# Altium schematic symbol library jlcpcb_2025_04_capacitors_extended_1210.schlib: 709 symbols (part 4 of 4) (continued)
## SQCB7M820FAT1A
designator C?  Capacitance: 82pF  (hidden comment: *)
Capacitor, Ceramic (MLCC), 82pF, ±1%, 500V, ±1%, SMD 1210; Manufacturer: AVX; Manufacturer Part Number: SQCB7M820FAT1A; Package Size: 1210; JLCPCB Basic Part: No; JLCPCB Part Number: C209936; Supplier 1: LCSC; Category: Capacitors - MLCC; Supplier Part Number 1: C209936; Tolerance: ±1%; Voltage Rating: 500V; RoHS: Yes; ComponentLink1Description: Datasheet; ComponentLink1URL: https://wmsc.lcsc.com/wmsc/upload/file/pdf/v2/lcsc/1808131157_Kyocera-AVX-SQCB7M820FAT1A_C209936.pdf; ComponentLink2Description: JLCPCB Part URL; ComponentLink2URL: https://jlcpcb.com/partdetail/C209936; ComponentLink3Description: LCSC Part URL; ComponentLink3URL: https://lcsc.com/product-detail/Multilayer-Ceramic-Capacitors-MLCC---SMD-SMT_Kyocera-AVX-Kyocera-AVX-SQCB7M820FAT1A_C209936.html
footprint CAP-1210 (1210 (3225M) Capacitor)
pins: 1, 2

## TCC1210X5R106K160GT
designator C?  Capacitance: 10uF  (hidden comment: *)
Capacitor, Ceramic (MLCC), 10uF, ±10%, 16V, X5R, ±10%, SMD 1210; Manufacturer: CCTC; Manufacturer Part Number: TCC1210X5R106K160GT; Package Size: 1210; JLCPCB Basic Part: No; JLCPCB Part Number: C380367; Supplier 1: LCSC; Category: Capacitors - MLCC; Supplier Part Number 1: C380367; Tolerance: ±10%; Voltage Rating: 16V; Temperature Coefficient: X5R; RoHS: Yes; ComponentLink1Description: Datasheet; ComponentLink1URL: https://wmsc.lcsc.com/wmsc/upload/file/pdf/v2/lcsc/2304140030_CCTC-TCC1210X5R106K160GT_C380367.pdf; ComponentLink2Description: JLCPCB Part URL; ComponentLink2URL: https://jlcpcb.com/partdetail/C380367; ComponentLink3Description: LCSC Part URL; ComponentLink3URL: https://lcsc.com/product-detail/Multilayer-Ceramic-Capacitors-MLCC---SMD-SMT_CCTC-CCTC-TCC1210X5R106K160GT_C380367.html
footprint CAP-1210 (1210 (3225M) Capacitor)
pins: 1, 2

## TCC1210X7R104K251FT
designator C?  Capacitance: 100nF  (hidden comment: *)
Capacitor, Ceramic (MLCC), 100nF, ±10%, 250V, X7R, ±10%, SMD 1210; Manufacturer: CCTC; Manufacturer Part Number: TCC1210X7R104K251FT; Package Size: 1210; JLCPCB Basic Part: No; JLCPCB Part Number: C377121; Supplier 1: LCSC; Category: Capacitors - MLCC; Supplier Part Number 1: C377121; Tolerance: ±10%; Voltage Rating: 250V; Temperature Coefficient: X7R; RoHS: Yes; ComponentLink1Description: Datasheet; ComponentLink1URL: https://wmsc.lcsc.com/wmsc/upload/file/pdf/v2/lcsc/2304140030_CCTC-TCC1210X7R104K251FT_C377121.pdf; ComponentLink2Description: JLCPCB Part URL; ComponentLink2URL: https://jlcpcb.com/partdetail/C377121; ComponentLink3Description: LCSC Part URL; ComponentLink3URL: https://lcsc.com/product-detail/Multilayer-Ceramic-Capacitors-MLCC---SMD-SMT_CCTC-CCTC-TCC1210X7R104K251FT_C377121.html
footprint CAP-1210 (1210 (3225M) Capacitor)
pins: 1, 2

## TCC1210X7R104K501HT
designator C?  Capacitance: 100nF  (hidden comment: *)
Capacitor, Ceramic (MLCC), 100nF, ±10%, 500V, X7R, ±10%, SMD 1210; Manufacturer: CCTC; Manufacturer Part Number: TCC1210X7R104K501HT; Package Size: 1210; JLCPCB Basic Part: No; JLCPCB Part Number: C377122; Supplier 1: LCSC; Category: Capacitors - MLCC; Supplier Part Number 1: C377122; Tolerance: ±10%; Voltage Rating: 500V; Temperature Coefficient: X7R; RoHS: Yes; ComponentLink1Description: Datasheet; ComponentLink1URL: https://wmsc.lcsc.com/wmsc/upload/file/pdf/v2/lcsc/2304140030_CCTC-TCC1210X7R104K501HT_C377122.pdf; ComponentLink2Description: JLCPCB Part URL; ComponentLink2URL: https://jlcpcb.com/partdetail/C377122; ComponentLink3Description: LCSC Part URL; ComponentLink3URL: https://lcsc.com/product-detail/Multilayer-Ceramic-Capacitors-MLCC---SMD-SMT_CCTC-CCTC-TCC1210X7R104K501HT_C377122.html
footprint CAP-1210 (1210 (3225M) Capacitor)
pins: 1, 2

## TCC1210X7R105K101HT
designator C?  Capacitance: 1uF  (hidden comment: *)
Capacitor, Ceramic (MLCC), 1uF, ±10%, 100V, X7R, ±10%, SMD 1210; Manufacturer: CCTC; Manufacturer Part Number: TCC1210X7R105K101HT; Package Size: 1210; JLCPCB Basic Part: No; JLCPCB Part Number: C377123; Supplier 1: LCSC; Category: Capacitors - MLCC; Supplier Part Number 1: C377123; Tolerance: ±10%; Voltage Rating: 100V; Temperature Coefficient: X7R; RoHS: Yes; ComponentLink1Description: Datasheet; ComponentLink1URL: https://wmsc.lcsc.com/wmsc/upload/file/pdf/v2/lcsc/2304140030_CCTC-TCC1210X7R105K101HT_C377123.pdf; ComponentLink2Description: JLCPCB Part URL; ComponentLink2URL: https://jlcpcb.com/partdetail/C377123; ComponentLink3Description: LCSC Part URL; ComponentLink3URL: https://lcsc.com/product-detail/Multilayer-Ceramic-Capacitors-MLCC---SMD-SMT_CCTC-CCTC-TCC1210X7R105K101HT_C377123.html
footprint CAP-1210 (1210 (3225M) Capacitor)
pins: 1, 2

## TCC1210X7R222K102FT
designator C?  Capacitance: 2.2nF  (hidden comment: *)
Capacitor, Ceramic (MLCC), 2.2nF, ±10%, 1kV, X7R, ±10%, SMD 1210; Manufacturer: CCTC; Manufacturer Part Number: TCC1210X7R222K102FT; Package Size: 1210; JLCPCB Basic Part: No; JLCPCB Part Number: C377124; Supplier 1: LCSC; Category: Capacitors - MLCC; Supplier Part Number 1: C377124; Tolerance: ±10%; Voltage Rating: 1kV; Temperature Coefficient: X7R; RoHS: Yes; ComponentLink1Description: Datasheet; ComponentLink1URL: https://wmsc.lcsc.com/wmsc/upload/file/pdf/v2/lcsc/2304140030_CCTC-TCC1210X7R222K102FT_C377124.pdf; ComponentLink2Description: JLCPCB Part URL; ComponentLink2URL: https://jlcpcb.com/partdetail/C377124; ComponentLink3Description: LCSC Part URL; ComponentLink3URL: https://lcsc.com/product-detail/Multilayer-Ceramic-Capacitors-MLCC---SMD-SMT_CCTC-CCTC-TCC1210X7R222K102FT_C377124.html
footprint CAP-1210 (1210 (3225M) Capacitor)
pins: 1, 2

## TCC1210X7R223K102FT
designator C?  Capacitance: 22nF  (hidden comment: *)
Capacitor, Ceramic (MLCC), 22nF, ±10%, 1kV, X7R, ±10%, SMD 1210; Manufacturer: CCTC; Manufacturer Part Number: TCC1210X7R223K102FT; Package Size: 1210; JLCPCB Basic Part: No; JLCPCB Part Number: C377125; Supplier 1: LCSC; Category: Capacitors - MLCC; Supplier Part Number 1: C377125; Tolerance: ±10%; Voltage Rating: 1kV; Temperature Coefficient: X7R; RoHS: Yes; ComponentLink1Description: Datasheet; ComponentLink1URL: https://wmsc.lcsc.com/wmsc/upload/file/pdf/v2/lcsc/2304140030_CCTC-TCC1210X7R223K102FT_C377125.pdf; ComponentLink2Description: JLCPCB Part URL; ComponentLink2URL: https://jlcpcb.com/partdetail/C377125; ComponentLink3Description: LCSC Part URL; ComponentLink3URL: https://lcsc.com/product-detail/Multilayer-Ceramic-Capacitors-MLCC---SMD-SMT_CCTC-CCTC-TCC1210X7R223K102FT_C377125.html
footprint CAP-1210 (1210 (3225M) Capacitor)
pins: 1, 2

## TCC1210X7R223K102HT
designator C?  Capacitance: 22nF  (hidden comment: *)
Capacitor, Ceramic (MLCC), 22nF, ±10%, 1kV, X7R, ±10%, SMD 1210; Manufacturer: CCTC; Manufacturer Part Number: TCC1210X7R223K102HT; Package Size: 1210; JLCPCB Basic Part: No; JLCPCB Part Number: C282886; Supplier 1: LCSC; Category: Capacitors - MLCC; Supplier Part Number 1: C282886; Tolerance: ±10%; Voltage Rating: 1kV; Temperature Coefficient: X7R; RoHS: Yes; ComponentLink1Description: Datasheet; ComponentLink1URL: https://wmsc.lcsc.com/wmsc/upload/file/pdf/v2/lcsc/2304140030_CCTC-TCC1210X7R223K102HT_C282886.pdf; ComponentLink2Description: JLCPCB Part URL; ComponentLink2URL: https://jlcpcb.com/partdetail/C282886; ComponentLink3Description: LCSC Part URL; ComponentLink3URL: https://lcsc.com/product-detail/Multilayer-Ceramic-Capacitors-MLCC---SMD-SMT_CCTC-CCTC-TCC1210X7R223K102HT_C282886.html
footprint CAP-1210 (1210 (3225M) Capacitor)
pins: 1, 2

## TCC1210X7R225K500HT
designator C?  Capacitance: 2.2uF  (hidden comment: *)
Capacitor, Ceramic (MLCC), 2.2uF, ±10%, 50V, X7R, ±10%, SMD 1210; Manufacturer: CCTC; Manufacturer Part Number: TCC1210X7R225K500HT; Package Size: 1210; JLCPCB Basic Part: No; JLCPCB Part Number: C377126; Supplier 1: LCSC; Category: Capacitors - MLCC; Supplier Part Number 1: C377126; Tolerance: ±10%; Voltage Rating: 50V; Temperature Coefficient: X7R; RoHS: Yes; ComponentLink1Description: Datasheet; ComponentLink1URL: https://wmsc.lcsc.com/wmsc/upload/file/pdf/v2/lcsc/2304140030_CCTC-TCC1210X7R225K500HT_C377126.pdf; ComponentLink2Description: JLCPCB Part URL; ComponentLink2URL: https://jlcpcb.com/partdetail/C377126; ComponentLink3Description: LCSC Part URL; ComponentLink3URL: https://lcsc.com/product-detail/Multilayer-Ceramic-Capacitors-MLCC---SMD-SMT_CCTC-CCTC-TCC1210X7R225K500HT_C377126.html
footprint CAP-1210 (1210 (3225M) Capacitor)
pins: 1, 2

## TCC1210X7R475K500GT
designator C?  Capacitance: 4.7uF  (hidden comment: *)
Capacitor, Ceramic (MLCC), 4.7uF, ±10%, 50V, X7R, ±10%, SMD 1210; Manufacturer: CCTC; Manufacturer Part Number: TCC1210X7R475K500GT; Package Size: 1210; JLCPCB Basic Part: No; JLCPCB Part Number: C380375; Supplier 1: LCSC; Category: Capacitors - MLCC; Supplier Part Number 1: C380375; Tolerance: ±10%; Voltage Rating: 50V; Temperature Coefficient: X7R; RoHS: Yes; ComponentLink1Description: Datasheet; ComponentLink1URL: https://wmsc.lcsc.com/wmsc/upload/file/pdf/v2/lcsc/2304140030_CCTC-TCC1210X7R475K500GT_C380375.pdf; ComponentLink2Description: JLCPCB Part URL; ComponentLink2URL: https://jlcpcb.com/partdetail/C380375; ComponentLink3Description: LCSC Part URL; ComponentLink3URL: https://lcsc.com/product-detail/Multilayer-Ceramic-Capacitors-MLCC---SMD-SMT_CCTC-CCTC-TCC1210X7R475K500GT_C380375.html
footprint CAP-1210 (1210 (3225M) Capacitor)
pins: 1, 2

## TCC1210X7R683K251HT
designator C?  Capacitance: 68nF  (hidden comment: *)
Capacitor, Ceramic (MLCC), 68nF, ±10%, 250V, X7R, ±10%, SMD 1210; Manufacturer: CCTC; Manufacturer Part Number: TCC1210X7R683K251HT; Package Size: 1210; JLCPCB Basic Part: No; JLCPCB Part Number: C377128; Supplier 1: LCSC; Category: Capacitors - MLCC; Supplier Part Number 1: C377128; Tolerance: ±10%; Voltage Rating: 250V; Temperature Coefficient: X7R; RoHS: Yes; ComponentLink1Description: Datasheet; ComponentLink1URL: https://wmsc.lcsc.com/wmsc/upload/file/pdf/v2/lcsc/2304140030_CCTC-TCC1210X7R683K251HT_C377128.pdf; ComponentLink2Description: JLCPCB Part URL; ComponentLink2URL: https://jlcpcb.com/partdetail/C377128; ComponentLink3Description: LCSC Part URL; ComponentLink3URL: https://lcsc.com/product-detail/Multilayer-Ceramic-Capacitors-MLCC---SMD-SMT_CCTC-CCTC-TCC1210X7R683K251HT_C377128.html
footprint CAP-1210 (1210 (3225M) Capacitor)
pins: 1, 2

## TMK325AB7106KMHPR
designator C?  Capacitance: 10uF  (hidden comment: *)
Capacitor, Ceramic (MLCC), 10uF, ±10%, 25V, X7R, ±10%, SMD 1210; Manufacturer: Taiyo Yuden; Manufacturer Part Number: TMK325AB7106KMHPR; Package Size: 1210; JLCPCB Basic Part: No; JLCPCB Part Number: C386095; Supplier 1: LCSC; Category: Capacitors - MLCC; Supplier Part Number 1: C386095; Tolerance: ±10%; Voltage Rating: 25V; Temperature Coefficient: X7R; RoHS: Yes; ComponentLink1Description: Datasheet; ComponentLink1URL: https://wmsc.lcsc.com/wmsc/upload/file/pdf/v2/lcsc/2211282230_Taiyo-Yuden-TMK325AB7106KMHPR_C386095.pdf; ComponentLink2Description: JLCPCB Part URL; ComponentLink2URL: https://jlcpcb.com/partdetail/C386095; ComponentLink3Description: LCSC Part URL; ComponentLink3URL: https://lcsc.com/product-detail/Multilayer-Ceramic-Capacitors-MLCC---SMD-SMT_Taiyo-Yuden-Taiyo-Yuden-TMK325AB7106KMHPR_C386095.html
footprint CAP-1210 (1210 (3225M) Capacitor)
pins: 1, 2

## TMK325ABJ476MM-P
designator C?  Capacitance: 47uF  (hidden comment: *)
Capacitor, Ceramic (MLCC), 47uF, ±20%, 25V, X5R, ±20%, SMD 1210; Manufacturer: Taiyo Yuden; Manufacturer Part Number: TMK325ABJ476MM-P; Package Size: 1210; JLCPCB Basic Part: No; JLCPCB Part Number: C90142; Supplier 1: LCSC; Category: Capacitors - MLCC; Supplier Part Number 1: C90142; Tolerance: ±20%; Voltage Rating: 25V; Temperature Coefficient: X5R; RoHS: Yes; ComponentLink1Description: Datasheet; ComponentLink1URL: https://wmsc.lcsc.com/wmsc/upload/file/pdf/v2/lcsc/2007130932_Taiyo-Yuden-TMK325ABJ476MM-P_C90142.pdf; ComponentLink2Description: JLCPCB Part URL; ComponentLink2URL: https://jlcpcb.com/partdetail/C90142; ComponentLink3Description: LCSC Part URL; ComponentLink3URL: https://lcsc.com/product-detail/Multilayer-Ceramic-Capacitors-MLCC---SMD-SMT_Taiyo-Yuden-Taiyo-Yuden-TMK325ABJ476MM-P_C90142.html
footprint CAP-1210 (1210 (3225M) Capacitor)
pins: 1, 2

## TMK325ABJ476MM-T
designator C?  Capacitance: 47uF  (hidden comment: *)
Capacitor, Ceramic (MLCC), 47uF, ±20%, 25V, X5R, ±20%, SMD 1210; Manufacturer: Taiyo Yuden; Manufacturer Part Number: TMK325ABJ476MM-T; Package Size: 1210; JLCPCB Basic Part: No; JLCPCB Part Number: C555369; Supplier 1: LCSC; Category: Capacitors - MLCC; Supplier Part Number 1: C555369; Tolerance: ±20%; Voltage Rating: 25V; Temperature Coefficient: X5R; RoHS: Yes; ComponentLink1Description: Datasheet; ComponentLink1URL: https://wmsc.lcsc.com/wmsc/upload/file/pdf/v2/lcsc/2007141915_Taiyo-Yuden-TMK325ABJ476MM-T_C555369.pdf; ComponentLink2Description: JLCPCB Part URL; ComponentLink2URL: https://jlcpcb.com/partdetail/C555369; ComponentLink3Description: LCSC Part URL; ComponentLink3URL: https://lcsc.com/product-detail/Multilayer-Ceramic-Capacitors-MLCC---SMD-SMT_Taiyo-Yuden-Taiyo-Yuden-TMK325ABJ476MM-T_C555369.html
footprint CAP-1210 (1210 (3225M) Capacitor)
pins: 1, 2

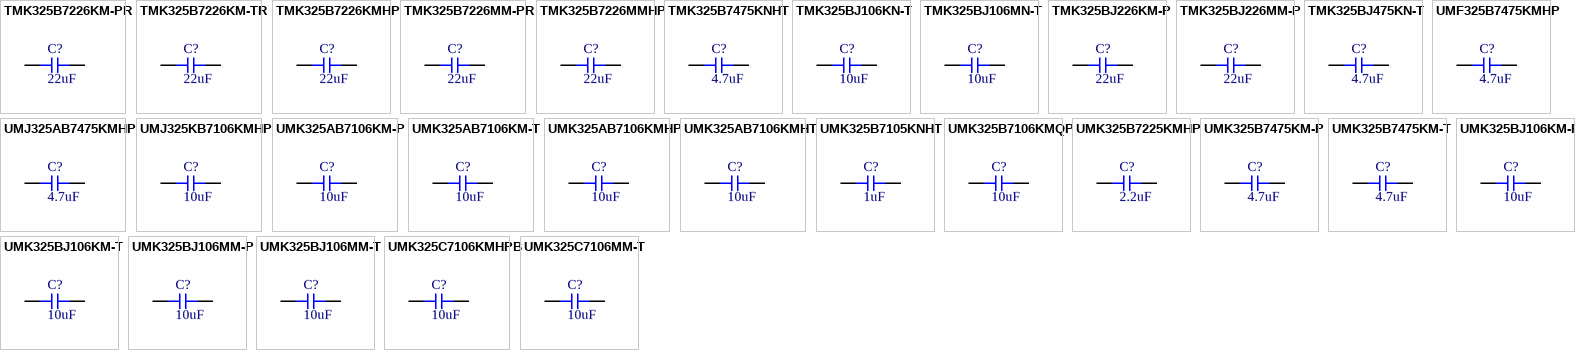
[diagram p17: symbols TMK325B7226KM-PR to UMK325C7106MM-T]

## TMK325B7226KM-PR
designator C?  Capacitance: 22uF  (hidden comment: *)
Capacitor, Ceramic (MLCC), 22uF, ±10%, 25V, X7R, ±10%, SMD 1210; Manufacturer: Taiyo Yuden; Manufacturer Part Number: TMK325B7226KM-PR; Package Size: 1210; JLCPCB Basic Part: No; JLCPCB Part Number: C337451; Supplier 1: LCSC; Category: Capacitors - MLCC; Supplier Part Number 1: C337451; Tolerance: ±10%; Voltage Rating: 25V; Temperature Coefficient: X7R; RoHS: Yes; ComponentLink1Description: Datasheet; ComponentLink1URL: https://wmsc.lcsc.com/wmsc/upload/file/pdf/v2/lcsc/2304140030_Taiyo-Yuden-TMK325B7226KM-PR_C337451.pdf; ComponentLink2Description: JLCPCB Part URL; ComponentLink2URL: https://jlcpcb.com/partdetail/C337451; ComponentLink3Description: LCSC Part URL; ComponentLink3URL: https://lcsc.com/product-detail/Multilayer-Ceramic-Capacitors-MLCC---SMD-SMT_Taiyo-Yuden-Taiyo-Yuden-TMK325B7226KM-PR_C337451.html
footprint CAP-1210 (1210 (3225M) Capacitor)
pins: 1, 2

## TMK325B7226KM-TR
designator C?  Capacitance: 22uF  (hidden comment: *)
Capacitor, Ceramic (MLCC), 22uF, ±10%, 25V, X7R, ±10%, SMD 1210; Manufacturer: Taiyo Yuden; Manufacturer Part Number: TMK325B7226KM-TR; Package Size: 1210; JLCPCB Basic Part: No; JLCPCB Part Number: C337455; Supplier 1: LCSC; Category: Capacitors - MLCC; Supplier Part Number 1: C337455; Tolerance: ±10%; Voltage Rating: 25V; Temperature Coefficient: X7R; RoHS: Yes; ComponentLink1Description: Datasheet; ComponentLink1URL: https://wmsc.lcsc.com/wmsc/upload/file/pdf/v2/lcsc/2304140030_Taiyo-Yuden-TMK325B7226KM-TR_C337455.pdf; ComponentLink2Description: JLCPCB Part URL; ComponentLink2URL: https://jlcpcb.com/partdetail/C337455; ComponentLink3Description: LCSC Part URL; ComponentLink3URL: https://lcsc.com/product-detail/Multilayer-Ceramic-Capacitors-MLCC---SMD-SMT_Taiyo-Yuden-Taiyo-Yuden-TMK325B7226KM-TR_C337455.html
footprint CAP-1210 (1210 (3225M) Capacitor)
pins: 1, 2

## TMK325B7226KMHP
designator C?  Capacitance: 22uF  (hidden comment: *)
Capacitor, Ceramic (MLCC), 22uF, ±10%, 25V, X7R, ±10%, SMD 1210; Manufacturer: Taiyo Yuden; Manufacturer Part Number: TMK325B7226KMHP; Package Size: 1210; JLCPCB Basic Part: No; JLCPCB Part Number: C386098; Supplier 1: LCSC; Category: Capacitors - MLCC; Supplier Part Number 1: C386098; Tolerance: ±10%; Voltage Rating: 25V; Temperature Coefficient: X7R; RoHS: Yes; ComponentLink1Description: Datasheet; ComponentLink1URL: https://wmsc.lcsc.com/wmsc/upload/file/pdf/v2/lcsc/2304140030_Taiyo-Yuden-TMK325B7226KMHP_C386098.pdf; ComponentLink2Description: JLCPCB Part URL; ComponentLink2URL: https://jlcpcb.com/partdetail/C386098; ComponentLink3Description: LCSC Part URL; ComponentLink3URL: https://lcsc.com/product-detail/Multilayer-Ceramic-Capacitors-MLCC---SMD-SMT_Taiyo-Yuden-Taiyo-Yuden-TMK325B7226KMHP_C386098.html
footprint CAP-1210 (1210 (3225M) Capacitor)
pins: 1, 2

## TMK325B7226MM-PR
designator C?  Capacitance: 22uF  (hidden comment: *)
Capacitor, Ceramic (MLCC), 22uF, ±20%, 25V, X7R, ±20%, SMD 1210; Manufacturer: Taiyo Yuden; Manufacturer Part Number: TMK325B7226MM-PR; Package Size: 1210; JLCPCB Basic Part: No; JLCPCB Part Number: C3885869; Supplier 1: LCSC; Category: Capacitors - MLCC; Supplier Part Number 1: C3885869; Tolerance: ±20%; Voltage Rating: 25V; Temperature Coefficient: X7R; RoHS: Yes; ComponentLink1Description: Datasheet; ComponentLink1URL: https://wmsc.lcsc.com/wmsc/upload/file/pdf/v2/lcsc/2309051414_Taiyo-Yuden-TMK325B7226MM-PR_C3885869.pdf; ComponentLink2Description: JLCPCB Part URL; ComponentLink2URL: https://jlcpcb.com/partdetail/C3885869; ComponentLink3Description: LCSC Part URL; ComponentLink3URL: https://lcsc.com/product-detail/Multilayer-Ceramic-Capacitors-MLCC---SMD-SMT_Taiyo-Yuden-Taiyo-Yuden-TMK325B7226MM-PR_C3885869.html
footprint CAP-1210 (1210 (3225M) Capacitor)
pins: 1, 2

## TMK325B7226MMHP
designator C?  Capacitance: 22uF  (hidden comment: *)
Capacitor, Ceramic (MLCC), 22uF, ±20%, 25V, X7R, ±20%, SMD 1210; Manufacturer: Taiyo Yuden; Manufacturer Part Number: TMK325B7226MMHP; Package Size: 1210; JLCPCB Basic Part: No; JLCPCB Part Number: C650995; Supplier 1: LCSC; Category: Capacitors - MLCC; Supplier Part Number 1: C650995; Tolerance: ±20%; Voltage Rating: 25V; Temperature Coefficient: X7R; RoHS: Yes; ComponentLink1Description: Datasheet; ComponentLink1URL: https://wmsc.lcsc.com/wmsc/upload/file/pdf/v2/lcsc/2304140030_Taiyo-Yuden-TMK325B7226MMHP_C650995.pdf; ComponentLink2Description: JLCPCB Part URL; ComponentLink2URL: https://jlcpcb.com/partdetail/C650995; ComponentLink3Description: LCSC Part URL; ComponentLink3URL: https://lcsc.com/product-detail/Multilayer-Ceramic-Capacitors-MLCC---SMD-SMT_Taiyo-Yuden-Taiyo-Yuden-TMK325B7226MMHP_C650995.html
footprint CAP-1210 (1210 (3225M) Capacitor)
pins: 1, 2

## TMK325B7475KNHT
designator C?  Capacitance: 4.7uF  (hidden comment: *)
Capacitor, Ceramic (MLCC), 4.7uF, ±10%, 25V, X7R, ±10%, SMD 1210; Manufacturer: Taiyo Yuden; Manufacturer Part Number: TMK325B7475KNHT; Package Size: 1210; JLCPCB Basic Part: No; JLCPCB Part Number: C650985; Supplier 1: LCSC; Category: Capacitors - MLCC; Supplier Part Number 1: C650985; Tolerance: ±10%; Voltage Rating: 25V; Temperature Coefficient: X7R; RoHS: Yes; ComponentLink1Description: Datasheet; ComponentLink1URL: https://wmsc.lcsc.com/wmsc/upload/file/pdf/v2/lcsc/2304140030_Taiyo-Yuden-TMK325B7475KNHT_C650985.pdf; ComponentLink2Description: JLCPCB Part URL; ComponentLink2URL: https://jlcpcb.com/partdetail/C650985; ComponentLink3Description: LCSC Part URL; ComponentLink3URL: https://lcsc.com/product-detail/Multilayer-Ceramic-Capacitors-MLCC---SMD-SMT_Taiyo-Yuden-Taiyo-Yuden-TMK325B7475KNHT_C650985.html
footprint CAP-1210 (1210 (3225M) Capacitor)
pins: 1, 2

## TMK325BJ106KN-T
designator C?  Capacitance: 10uF  (hidden comment: *)
Capacitor, Ceramic (MLCC), 10uF, ±10%, 25V, X5R, ±10%, SMD 1210; Manufacturer: Taiyo Yuden; Manufacturer Part Number: TMK325BJ106KN-T; Package Size: 1210; JLCPCB Basic Part: No; JLCPCB Part Number: C92834; Supplier 1: LCSC; Category: Capacitors - MLCC; Supplier Part Number 1: C92834; Tolerance: ±10%; Voltage Rating: 25V; Temperature Coefficient: X5R; RoHS: Yes; ComponentLink1Description: Datasheet; ComponentLink1URL: https://wmsc.lcsc.com/wmsc/upload/file/pdf/v2/lcsc/2211282300_Taiyo-Yuden-TMK325BJ106KN-T_C92834.pdf; ComponentLink2Description: JLCPCB Part URL; ComponentLink2URL: https://jlcpcb.com/partdetail/C92834; ComponentLink3Description: LCSC Part URL; ComponentLink3URL: https://lcsc.com/product-detail/Multilayer-Ceramic-Capacitors-MLCC---SMD-SMT_Taiyo-Yuden-Taiyo-Yuden-TMK325BJ106KN-T_C92834.html
footprint CAP-1210 (1210 (3225M) Capacitor)
pins: 1, 2

## TMK325BJ106MN-T
designator C?  Capacitance: 10uF  (hidden comment: *)
Capacitor, Ceramic (MLCC), 10uF, ±20%, 25V, X5R, ±20%, SMD 1210; Manufacturer: Taiyo Yuden; Manufacturer Part Number: TMK325BJ106MN-T; Package Size: 1210; JLCPCB Basic Part: No; JLCPCB Part Number: C3899668; Supplier 1: LCSC; Category: Capacitors - MLCC; Supplier Part Number 1: C3899668; Tolerance: ±20%; Voltage Rating: 25V; Temperature Coefficient: X5R; RoHS: Yes; ComponentLink1Description: Datasheet; ComponentLink1URL: https://wmsc.lcsc.com/wmsc/upload/file/pdf/v2/lcsc/2211281700_Taiyo-Yuden-TMK325BJ106MN-T_C3899668.pdf; ComponentLink2Description: JLCPCB Part URL; ComponentLink2URL: https://jlcpcb.com/partdetail/C3899668; ComponentLink3Description: LCSC Part URL; ComponentLink3URL: https://lcsc.com/product-detail/Multilayer-Ceramic-Capacitors-MLCC---SMD-SMT_Taiyo-Yuden-Taiyo-Yuden-TMK325BJ106MN-T_C3899668.html
footprint CAP-1210 (1210 (3225M) Capacitor)
pins: 1, 2

## TMK325BJ226KM-P
designator C?  Capacitance: 22uF  (hidden comment: *)
Capacitor, Ceramic (MLCC), 22uF, ±10%, 25V, X5R, ±10%, SMD 1210; Manufacturer: Taiyo Yuden; Manufacturer Part Number: TMK325BJ226KM-P; Package Size: 1210; JLCPCB Basic Part: No; JLCPCB Part Number: C268020; Supplier 1: LCSC; Category: Capacitors - MLCC; Supplier Part Number 1: C268020; Tolerance: ±10%; Voltage Rating: 25V; Temperature Coefficient: X5R; RoHS: Yes; ComponentLink1Description: Datasheet; ComponentLink1URL: https://wmsc.lcsc.com/wmsc/upload/file/pdf/v2/lcsc/2211282230_Taiyo-Yuden-TMK325BJ226KM-P_C268020.pdf; ComponentLink2Description: JLCPCB Part URL; ComponentLink2URL: https://jlcpcb.com/partdetail/C268020; ComponentLink3Description: LCSC Part URL; ComponentLink3URL: https://lcsc.com/product-detail/Multilayer-Ceramic-Capacitors-MLCC---SMD-SMT_Taiyo-Yuden-Taiyo-Yuden-TMK325BJ226KM-P_C268020.html
footprint CAP-1210 (1210 (3225M) Capacitor)
pins: 1, 2

## TMK325BJ226MM-P
designator C?  Capacitance: 22uF  (hidden comment: *)
Capacitor, Ceramic (MLCC), 22uF, ±20%, 25V, X5R, ±20%, SMD 1210; Manufacturer: Taiyo Yuden; Manufacturer Part Number: TMK325BJ226MM-P; Package Size: 1210; JLCPCB Basic Part: No; JLCPCB Part Number: C386102; Supplier 1: LCSC; Category: Capacitors - MLCC; Supplier Part Number 1: C386102; Tolerance: ±20%; Voltage Rating: 25V; Temperature Coefficient: X5R; RoHS: Yes; ComponentLink1Description: Datasheet; ComponentLink1URL: https://wmsc.lcsc.com/wmsc/upload/file/pdf/v2/lcsc/2211282230_Taiyo-Yuden-TMK325BJ226MM-P_C386102.pdf; ComponentLink2Description: JLCPCB Part URL; ComponentLink2URL: https://jlcpcb.com/partdetail/C386102; ComponentLink3Description: LCSC Part URL; ComponentLink3URL: https://lcsc.com/product-detail/Multilayer-Ceramic-Capacitors-MLCC---SMD-SMT_Taiyo-Yuden-Taiyo-Yuden-TMK325BJ226MM-P_C386102.html
footprint CAP-1210 (1210 (3225M) Capacitor)
pins: 1, 2

## TMK325BJ475KN-T
designator C?  Capacitance: 4.7uF  (hidden comment: *)
Capacitor, Ceramic (MLCC), 4.7uF, ±10%, 25V, X5R, ±10%, SMD 1210; Manufacturer: Taiyo Yuden; Manufacturer Part Number: TMK325BJ475KN-T; Package Size: 1210; JLCPCB Basic Part: No; JLCPCB Part Number: C92837; Supplier 1: LCSC; Category: Capacitors - MLCC; Supplier Part Number 1: C92837; Tolerance: ±10%; Voltage Rating: 25V; Temperature Coefficient: X5R; RoHS: Yes; ComponentLink1Description: Datasheet; ComponentLink1URL: https://wmsc.lcsc.com/wmsc/upload/file/pdf/v2/lcsc/2211282300_Taiyo-Yuden-TMK325BJ475KN-T_C92837.pdf; ComponentLink2Description: JLCPCB Part URL; ComponentLink2URL: https://jlcpcb.com/partdetail/C92837; ComponentLink3Description: LCSC Part URL; ComponentLink3URL: https://lcsc.com/product-detail/Multilayer-Ceramic-Capacitors-MLCC---SMD-SMT_Taiyo-Yuden-Taiyo-Yuden-TMK325BJ475KN-T_C92837.html
footprint CAP-1210 (1210 (3225M) Capacitor)
pins: 1, 2

## UMF325B7475KMHP
designator C?  Capacitance: 4.7uF  (hidden comment: *)
Capacitor, Ceramic (MLCC), 4.7uF, ±10%, 50V, X7R, ±10%, SMD 1210; Manufacturer: Taiyo Yuden; Manufacturer Part Number: UMF325B7475KMHP; Package Size: 1210; JLCPCB Basic Part: No; JLCPCB Part Number: C651017; Supplier 1: LCSC; Category: Capacitors - MLCC; Supplier Part Number 1: C651017; Tolerance: ±10%; Voltage Rating: 50V; Temperature Coefficient: X7R; RoHS: Yes; ComponentLink1Description: Datasheet; ComponentLink1URL: https://wmsc.lcsc.com/wmsc/upload/file/pdf/v2/lcsc/2304140030_Taiyo-Yuden-UMF325B7475KMHP_C651017.pdf; ComponentLink2Description: JLCPCB Part URL; ComponentLink2URL: https://jlcpcb.com/partdetail/C651017; ComponentLink3Description: LCSC Part URL; ComponentLink3URL: https://lcsc.com/product-detail/Multilayer-Ceramic-Capacitors-MLCC---SMD-SMT_Taiyo-Yuden-Taiyo-Yuden-UMF325B7475KMHP_C651017.html
footprint CAP-1210 (1210 (3225M) Capacitor)
pins: 1, 2

## UMJ325AB7475KMHP
designator C?  Capacitance: 4.7uF  (hidden comment: *)
Capacitor, Ceramic (MLCC), 4.7uF, ±10%, 50V, X7R, ±10%, SMD 1210; Manufacturer: Taiyo Yuden; Manufacturer Part Number: UMJ325AB7475KMHP; Package Size: 1210; JLCPCB Basic Part: No; JLCPCB Part Number: C412618; Supplier 1: LCSC; Category: Capacitors - MLCC; Supplier Part Number 1: C412618; Tolerance: ±10%; Voltage Rating: 50V; Temperature Coefficient: X7R; RoHS: Yes; ComponentLink1Description: Datasheet; ComponentLink1URL: https://wmsc.lcsc.com/wmsc/upload/file/pdf/v2/lcsc/2304140030_Taiyo-Yuden-UMJ325AB7475KMHP_C412618.pdf; ComponentLink2Description: JLCPCB Part URL; ComponentLink2URL: https://jlcpcb.com/partdetail/C412618; ComponentLink3Description: LCSC Part URL; ComponentLink3URL: https://lcsc.com/product-detail/Multilayer-Ceramic-Capacitors-MLCC---SMD-SMT_Taiyo-Yuden-Taiyo-Yuden-UMJ325AB7475KMHP_C412618.html
footprint CAP-1210 (1210 (3225M) Capacitor)
pins: 1, 2

## UMJ325KB7106KMHP
designator C?  Capacitance: 10uF  (hidden comment: *)
Capacitor, Ceramic (MLCC), 10uF, ±10%, 50V, X7R, ±10%, SMD 1210; Manufacturer: Taiyo Yuden; Manufacturer Part Number: UMJ325KB7106KMHP; Package Size: 1210; JLCPCB Basic Part: No; JLCPCB Part Number: C412619; Supplier 1: LCSC; Category: Capacitors - MLCC; Supplier Part Number 1: C412619; Tolerance: ±10%; Voltage Rating: 50V; Temperature Coefficient: X7R; RoHS: Yes; ComponentLink1Description: Datasheet; ComponentLink1URL: https://wmsc.lcsc.com/wmsc/upload/file/pdf/v2/lcsc/2304140030_Taiyo-Yuden-UMJ325KB7106KMHP_C412619.pdf; ComponentLink2Description: JLCPCB Part URL; ComponentLink2URL: https://jlcpcb.com/partdetail/C412619; ComponentLink3Description: LCSC Part URL; ComponentLink3URL: https://lcsc.com/product-detail/Multilayer-Ceramic-Capacitors-MLCC---SMD-SMT_Taiyo-Yuden-Taiyo-Yuden-UMJ325KB7106KMHP_C412619.html
footprint CAP-1210 (1210 (3225M) Capacitor)
pins: 1, 2

## UMK325AB7106KM-P
designator C?  Capacitance: 10uF  (hidden comment: *)
Capacitor, Ceramic (MLCC), 10uF, ±10%, 50V, X7R, ±10%, SMD 1210; Manufacturer: Taiyo Yuden; Manufacturer Part Number: UMK325AB7106KM-P; Package Size: 1210; JLCPCB Basic Part: No; JLCPCB Part Number: C337485; Supplier 1: LCSC; Category: Capacitors - MLCC; Supplier Part Number 1: C337485; Tolerance: ±10%; Voltage Rating: 50V; Temperature Coefficient: X7R; RoHS: Yes; ComponentLink1Description: Datasheet; ComponentLink1URL: https://wmsc.lcsc.com/wmsc/upload/file/pdf/v2/lcsc/2211282230_Taiyo-Yuden-UMK325AB7106KM-P_C337485.pdf; ComponentLink2Description: JLCPCB Part URL; ComponentLink2URL: https://jlcpcb.com/partdetail/C337485; ComponentLink3Description: LCSC Part URL; ComponentLink3URL: https://lcsc.com/product-detail/Multilayer-Ceramic-Capacitors-MLCC---SMD-SMT_Taiyo-Yuden-Taiyo-Yuden-UMK325AB7106KM-P_C337485.html
footprint CAP-1210 (1210 (3225M) Capacitor)
pins: 1, 2

## UMK325AB7106KM-T
designator C?  Capacitance: 10uF  (hidden comment: *)
Capacitor, Ceramic (MLCC), 10uF, ±10%, 50V, X7R, ±10%, SMD 1210; Manufacturer: Taiyo Yuden; Manufacturer Part Number: UMK325AB7106KM-T; Package Size: 1210; JLCPCB Basic Part: No; JLCPCB Part Number: C386167; Supplier 1: LCSC; Category: Capacitors - MLCC; Supplier Part Number 1: C386167; Tolerance: ±10%; Voltage Rating: 50V; Temperature Coefficient: X7R; RoHS: Yes; ComponentLink1Description: Datasheet; ComponentLink1URL: https://wmsc.lcsc.com/wmsc/upload/file/pdf/v2/lcsc/2211282230_Taiyo-Yuden-UMK325AB7106KM-T_C386167.pdf; ComponentLink2Description: JLCPCB Part URL; ComponentLink2URL: https://jlcpcb.com/partdetail/C386167; ComponentLink3Description: LCSC Part URL; ComponentLink3URL: https://lcsc.com/product-detail/Multilayer-Ceramic-Capacitors-MLCC---SMD-SMT_Taiyo-Yuden-Taiyo-Yuden-UMK325AB7106KM-T_C386167.html
footprint CAP-1210 (1210 (3225M) Capacitor)
pins: 1, 2

## UMK325AB7106KMHP
designator C?  Capacitance: 10uF  (hidden comment: *)
Capacitor, Ceramic (MLCC), 10uF, ±10%, 50V, X7R, ±10%, SMD 1210; Manufacturer: Taiyo Yuden; Manufacturer Part Number: UMK325AB7106KMHP; Package Size: 1210; JLCPCB Basic Part: No; JLCPCB Part Number: C386166; Supplier 1: LCSC; Category: Capacitors - MLCC; Supplier Part Number 1: C386166; Tolerance: ±10%; Voltage Rating: 50V; Temperature Coefficient: X7R; RoHS: Yes; ComponentLink1Description: Datasheet; ComponentLink1URL: https://wmsc.lcsc.com/wmsc/upload/file/pdf/v2/lcsc/2402211513_Taiyo-Yuden-UMK325AB7106KMHP_C386166.pdf; ComponentLink2Description: JLCPCB Part URL; ComponentLink2URL: https://jlcpcb.com/partdetail/C386166; ComponentLink3Description: LCSC Part URL; ComponentLink3URL: https://lcsc.com/product-detail/Multilayer-Ceramic-Capacitors-MLCC---SMD-SMT_Taiyo-Yuden-Taiyo-Yuden-UMK325AB7106KMHP_C386166.html
footprint CAP-1210 (1210 (3225M) Capacitor)
pins: 1, 2

## UMK325AB7106KMHT
designator C?  Capacitance: 10uF  (hidden comment: *)
Capacitor, Ceramic (MLCC), 10uF, ±10%, 50V, X7R, ±10%, SMD 1210; Manufacturer: Taiyo Yuden; Manufacturer Part Number: UMK325AB7106KMHT; Package Size: 1210; JLCPCB Basic Part: No; JLCPCB Part Number: C2181376; Supplier 1: LCSC; Category: Capacitors - MLCC; Supplier Part Number 1: C2181376; Tolerance: ±10%; Voltage Rating: 50V; Temperature Coefficient: X7R; RoHS: Yes; ComponentLink1Description: Datasheet; ComponentLink2Description: JLCPCB Part URL; ComponentLink2URL: https://jlcpcb.com/partdetail/C2181376; ComponentLink3Description: LCSC Part URL; ComponentLink3URL: https://lcsc.com/product-detail/Multilayer-Ceramic-Capacitors-MLCC---SMD-SMT_Taiyo-Yuden-Taiyo-Yuden-UMK325AB7106KMHT_C2181376.html
footprint CAP-1210 (1210 (3225M) Capacitor)
pins: 1, 2

## UMK325B7105KNHT
designator C?  Capacitance: 1uF  (hidden comment: *)
Capacitor, Ceramic (MLCC), 1uF, ±10%, 50V, X7R, ±10%, SMD 1210; Manufacturer: Taiyo Yuden; Manufacturer Part Number: UMK325B7105KNHT; Package Size: 1210; JLCPCB Basic Part: No; JLCPCB Part Number: C650953; Supplier 1: LCSC; Category: Capacitors - MLCC; Supplier Part Number 1: C650953; Tolerance: ±10%; Voltage Rating: 50V; Temperature Coefficient: X7R; RoHS: Yes; ComponentLink1Description: Datasheet; ComponentLink1URL: https://wmsc.lcsc.com/wmsc/upload/file/pdf/v2/lcsc/2304140030_Taiyo-Yuden-UMK325B7105KNHT_C650953.pdf; ComponentLink2Description: JLCPCB Part URL; ComponentLink2URL: https://jlcpcb.com/partdetail/C650953; ComponentLink3Description: LCSC Part URL; ComponentLink3URL: https://lcsc.com/product-detail/Multilayer-Ceramic-Capacitors-MLCC---SMD-SMT_Taiyo-Yuden-Taiyo-Yuden-UMK325B7105KNHT_C650953.html
footprint CAP-1210 (1210 (3225M) Capacitor)
pins: 1, 2

## UMK325B7106KMQP
designator C?  Capacitance: 10uF  (hidden comment: *)
Capacitor, Ceramic (MLCC), 10uF, ±10%, 50V, X7R, ±10%, SMD 1210; Manufacturer: Taiyo Yuden; Manufacturer Part Number: UMK325B7106KMQP; Package Size: 1210; JLCPCB Basic Part: No; JLCPCB Part Number: C2986064; Supplier 1: LCSC; Category: Capacitors - MLCC; Supplier Part Number 1: C2986064; Tolerance: ±10%; Voltage Rating: 50V; Temperature Coefficient: X7R; RoHS: Yes; ComponentLink1Description: Datasheet; ComponentLink1URL: https://wmsc.lcsc.com/wmsc/upload/file/pdf/v2/lcsc/2203281730_Taiyo-Yuden-UMK325B7106KMQP_C2986064.pdf; ComponentLink2Description: JLCPCB Part URL; ComponentLink2URL: https://jlcpcb.com/partdetail/C2986064; ComponentLink3Description: LCSC Part URL; ComponentLink3URL: https://lcsc.com/product-detail/Multilayer-Ceramic-Capacitors-MLCC---SMD-SMT_Taiyo-Yuden-Taiyo-Yuden-UMK325B7106KMQP_C2986064.html
footprint CAP-1210 (1210 (3225M) Capacitor)
pins: 1, 2

## UMK325B7225KMHP
designator C?  Capacitance: 2.2uF  (hidden comment: *)
Capacitor, Ceramic (MLCC), 2.2uF, ±10%, 50V, X7R, ±10%, SMD 1210; Manufacturer: Taiyo Yuden; Manufacturer Part Number: UMK325B7225KMHP; Package Size: 1210; JLCPCB Basic Part: No; JLCPCB Part Number: C650961; Supplier 1: LCSC; Category: Capacitors - MLCC; Supplier Part Number 1: C650961; Tolerance: ±10%; Voltage Rating: 50V; Temperature Coefficient: X7R; RoHS: Yes; ComponentLink1Description: Datasheet; ComponentLink1URL: https://wmsc.lcsc.com/wmsc/upload/file/pdf/v2/lcsc/2304140030_Taiyo-Yuden-UMK325B7225KMHP_C650961.pdf; ComponentLink2Description: JLCPCB Part URL; ComponentLink2URL: https://jlcpcb.com/partdetail/C650961; ComponentLink3Description: LCSC Part URL; ComponentLink3URL: https://lcsc.com/product-detail/Multilayer-Ceramic-Capacitors-MLCC---SMD-SMT_Taiyo-Yuden-Taiyo-Yuden-UMK325B7225KMHP_C650961.html
footprint CAP-1210 (1210 (3225M) Capacitor)
pins: 1, 2

## UMK325B7475KM-P
designator C?  Capacitance: 4.7uF  (hidden comment: *)
Capacitor, Ceramic (MLCC), 4.7uF, ±10%, 50V, X7R, ±10%, SMD 1210; Manufacturer: Taiyo Yuden; Manufacturer Part Number: UMK325B7475KM-P; Package Size: 1210; JLCPCB Basic Part: No; JLCPCB Part Number: C778722; Supplier 1: LCSC; Category: Capacitors - MLCC; Supplier Part Number 1: C778722; Tolerance: ±10%; Voltage Rating: 50V; Temperature Coefficient: X7R; RoHS: Yes; ComponentLink1Description: Datasheet; ComponentLink1URL: https://wmsc.lcsc.com/wmsc/upload/file/pdf/v2/lcsc/2304140030_Taiyo-Yuden-UMK325B7475KM-P_C778722.pdf; ComponentLink2Description: JLCPCB Part URL; ComponentLink2URL: https://jlcpcb.com/partdetail/C778722; ComponentLink3Description: LCSC Part URL; ComponentLink3URL: https://lcsc.com/product-detail/Multilayer-Ceramic-Capacitors-MLCC---SMD-SMT_Taiyo-Yuden-Taiyo-Yuden-UMK325B7475KM-P_C778722.html
footprint CAP-1210 (1210 (3225M) Capacitor)
pins: 1, 2

## UMK325B7475KM-T
designator C?  Capacitance: 4.7uF  (hidden comment: *)
Capacitor, Ceramic (MLCC), 4.7uF, ±10%, 50V, X7R, ±10%, SMD 1210; Manufacturer: Taiyo Yuden; Manufacturer Part Number: UMK325B7475KM-T; Package Size: 1210; JLCPCB Basic Part: No; JLCPCB Part Number: C337438; Supplier 1: LCSC; Category: Capacitors - MLCC; Supplier Part Number 1: C337438; Tolerance: ±10%; Voltage Rating: 50V; Temperature Coefficient: X7R; RoHS: Yes; ComponentLink1Description: Datasheet; ComponentLink1URL: https://wmsc.lcsc.com/wmsc/upload/file/pdf/v2/lcsc/2211282230_Taiyo-Yuden-UMK325B7475KM-T_C337438.pdf; ComponentLink2Description: JLCPCB Part URL; ComponentLink2URL: https://jlcpcb.com/partdetail/C337438; ComponentLink3Description: LCSC Part URL; ComponentLink3URL: https://lcsc.com/product-detail/Multilayer-Ceramic-Capacitors-MLCC---SMD-SMT_Taiyo-Yuden-Taiyo-Yuden-UMK325B7475KM-T_C337438.html
footprint CAP-1210 (1210 (3225M) Capacitor)
pins: 1, 2

## UMK325BJ106KM-P
designator C?  Capacitance: 10uF  (hidden comment: *)
Capacitor, Ceramic (MLCC), 10uF, ±10%, 50V, X5R, ±10%, SMD 1210; Manufacturer: Taiyo Yuden; Manufacturer Part Number: UMK325BJ106KM-P; Package Size: 1210; JLCPCB Basic Part: No; JLCPCB Part Number: C783006; Supplier 1: LCSC; Category: Capacitors - MLCC; Supplier Part Number 1: C783006; Tolerance: ±10%; Voltage Rating: 50V; Temperature Coefficient: X5R; RoHS: Yes; ComponentLink1Description: Datasheet; ComponentLink1URL: https://wmsc.lcsc.com/wmsc/upload/file/pdf/v2/lcsc/2009180305_Taiyo-Yuden-UMK325BJ106KM-P_C783006.pdf; ComponentLink2Description: JLCPCB Part URL; ComponentLink2URL: https://jlcpcb.com/partdetail/C783006; ComponentLink3Description: LCSC Part URL; ComponentLink3URL: https://lcsc.com/product-detail/Multilayer-Ceramic-Capacitors-MLCC---SMD-SMT_Taiyo-Yuden-Taiyo-Yuden-UMK325BJ106KM-P_C783006.html
footprint CAP-1210 (1210 (3225M) Capacitor)
pins: 1, 2

## UMK325BJ106KM-T
designator C?  Capacitance: 10uF  (hidden comment: *)
Capacitor, Ceramic (MLCC), 10uF, ±10%, 50V, X5R, ±10%, SMD 1210; Manufacturer: Taiyo Yuden; Manufacturer Part Number: UMK325BJ106KM-T; Package Size: 1210; JLCPCB Basic Part: No; JLCPCB Part Number: C92856; Supplier 1: LCSC; Category: Capacitors - MLCC; Supplier Part Number 1: C92856; Tolerance: ±10%; Voltage Rating: 50V; Temperature Coefficient: X5R; RoHS: Yes; ComponentLink1Description: Datasheet; ComponentLink1URL: https://wmsc.lcsc.com/wmsc/upload/file/pdf/v2/lcsc/2211282300_Taiyo-Yuden-UMK325BJ106KM-T_C92856.pdf; ComponentLink2Description: JLCPCB Part URL; ComponentLink2URL: https://jlcpcb.com/partdetail/C92856; ComponentLink3Description: LCSC Part URL; ComponentLink3URL: https://lcsc.com/product-detail/Multilayer-Ceramic-Capacitors-MLCC---SMD-SMT_Taiyo-Yuden-Taiyo-Yuden-UMK325BJ106KM-T_C92856.html
footprint CAP-1210 (1210 (3225M) Capacitor)
pins: 1, 2

## UMK325BJ106MM-P
designator C?  Capacitance: 10uF  (hidden comment: *)
Capacitor, Ceramic (MLCC), 10uF, ±20%, 50V, X5R, ±20%, SMD 1210; Manufacturer: Taiyo Yuden; Manufacturer Part Number: UMK325BJ106MM-P; Package Size: 1210; JLCPCB Basic Part: No; JLCPCB Part Number: C2178656; Supplier 1: LCSC; Category: Capacitors - MLCC; Supplier Part Number 1: C2178656; Tolerance: ±20%; Voltage Rating: 50V; Temperature Coefficient: X5R; RoHS: Yes; ComponentLink1Description: Datasheet; ComponentLink1URL: https://wmsc.lcsc.com/wmsc/upload/file/pdf/v2/lcsc/2211282000_Taiyo-Yuden-UMK325BJ106MM-P_C2178656.pdf; ComponentLink2Description: JLCPCB Part URL; ComponentLink2URL: https://jlcpcb.com/partdetail/C2178656; ComponentLink3Description: LCSC Part URL; ComponentLink3URL: https://lcsc.com/product-detail/Multilayer-Ceramic-Capacitors-MLCC---SMD-SMT_Taiyo-Yuden-Taiyo-Yuden-UMK325BJ106MM-P_C2178656.html
footprint CAP-1210 (1210 (3225M) Capacitor)
pins: 1, 2

## UMK325BJ106MM-T
designator C?  Capacitance: 10uF  (hidden comment: *)
Capacitor, Ceramic (MLCC), 10uF, ±20%, 50V, X5R, ±20%, SMD 1210; Manufacturer: Taiyo Yuden; Manufacturer Part Number: UMK325BJ106MM-T; Package Size: 1210; JLCPCB Basic Part: No; JLCPCB Part Number: C386170; Supplier 1: LCSC; Category: Capacitors - MLCC; Supplier Part Number 1: C386170; Tolerance: ±20%; Voltage Rating: 50V; Temperature Coefficient: X5R; RoHS: Yes; ComponentLink1Description: Datasheet; ComponentLink1URL: https://wmsc.lcsc.com/wmsc/upload/file/pdf/v2/lcsc/2211282230_Taiyo-Yuden-UMK325BJ106MM-T_C386170.pdf; ComponentLink2Description: JLCPCB Part URL; ComponentLink2URL: https://jlcpcb.com/partdetail/C386170; ComponentLink3Description: LCSC Part URL; ComponentLink3URL: https://lcsc.com/product-detail/Multilayer-Ceramic-Capacitors-MLCC---SMD-SMT_Taiyo-Yuden-Taiyo-Yuden-UMK325BJ106MM-T_C386170.html
footprint CAP-1210 (1210 (3225M) Capacitor)
pins: 1, 2

## UMK325C7106KMHPB
designator C?  Capacitance: 10uF  (hidden comment: *)
Capacitor, Ceramic (MLCC), 10uF, ±10%, 50V, X7S, ±10%, SMD 1210; Manufacturer: Taiyo Yuden; Manufacturer Part Number: UMK325C7106KMHPB; Package Size: 1210; JLCPCB Basic Part: No; JLCPCB Part Number: C2880419; Supplier 1: LCSC; Category: Capacitors - MLCC; Supplier Part Number 1: C2880419; Tolerance: ±10%; Voltage Rating: 50V; Temperature Coefficient: X7S; RoHS: Yes; ComponentLink1Description: Datasheet; ComponentLink1URL: https://wmsc.lcsc.com/wmsc/upload/file/pdf/v2/lcsc/2108160930_Taiyo-Yuden-UMK325C7106KMHPB_C2880419.pdf; ComponentLink2Description: JLCPCB Part URL; ComponentLink2URL: https://jlcpcb.com/partdetail/C2880419; ComponentLink3Description: LCSC Part URL; ComponentLink3URL: https://lcsc.com/product-detail/Multilayer-Ceramic-Capacitors-MLCC---SMD-SMT_Taiyo-Yuden-Taiyo-Yuden-UMK325C7106KMHPB_C2880419.html
footprint CAP-1210 (1210 (3225M) Capacitor)
pins: 1, 2

## UMK325C7106MM-T
designator C?  Capacitance: 10uF  (hidden comment: *)
Capacitor, Ceramic (MLCC), 10uF, ±20%, 50V, X7S, ±20%, SMD 1210; Manufacturer: Taiyo Yuden; Manufacturer Part Number: UMK325C7106MM-T; Package Size: 1210; JLCPCB Basic Part: No; JLCPCB Part Number: C141666; Supplier 1: LCSC; Category: Capacitors - MLCC; Supplier Part Number 1: C141666; Tolerance: ±20%; Voltage Rating: 50V; Temperature Coefficient: X7S; RoHS: Yes; ComponentLink1Description: Datasheet; ComponentLink1URL: https://wmsc.lcsc.com/wmsc/upload/file/pdf/v2/lcsc/2211282300_Taiyo-Yuden-UMK325C7106MM-T_C141666.pdf; ComponentLink2Description: JLCPCB Part URL; ComponentLink2URL: https://jlcpcb.com/partdetail/C141666; ComponentLink3Description: LCSC Part URL; ComponentLink3URL: https://lcsc.com/product-detail/Multilayer-Ceramic-Capacitors-MLCC---SMD-SMT_Taiyo-Yuden-Taiyo-Yuden-UMK325C7106MM-T_C141666.html
footprint CAP-1210 (1210 (3225M) Capacitor)
pins: 1, 2